# Altium footprint library Boris_IO.PcbLib: 57 footprints (part 3 of 4)
Each footprint in its own frame and in the unit in brackets; x right, y up, seen from the top. Pads: shape width x height; smd on the part's side, far side on the other; paste and mask are expansions set on the pad; w line width, h text height; cw(c..) or ccw(c..) is an arc to the next point about the centre after c.
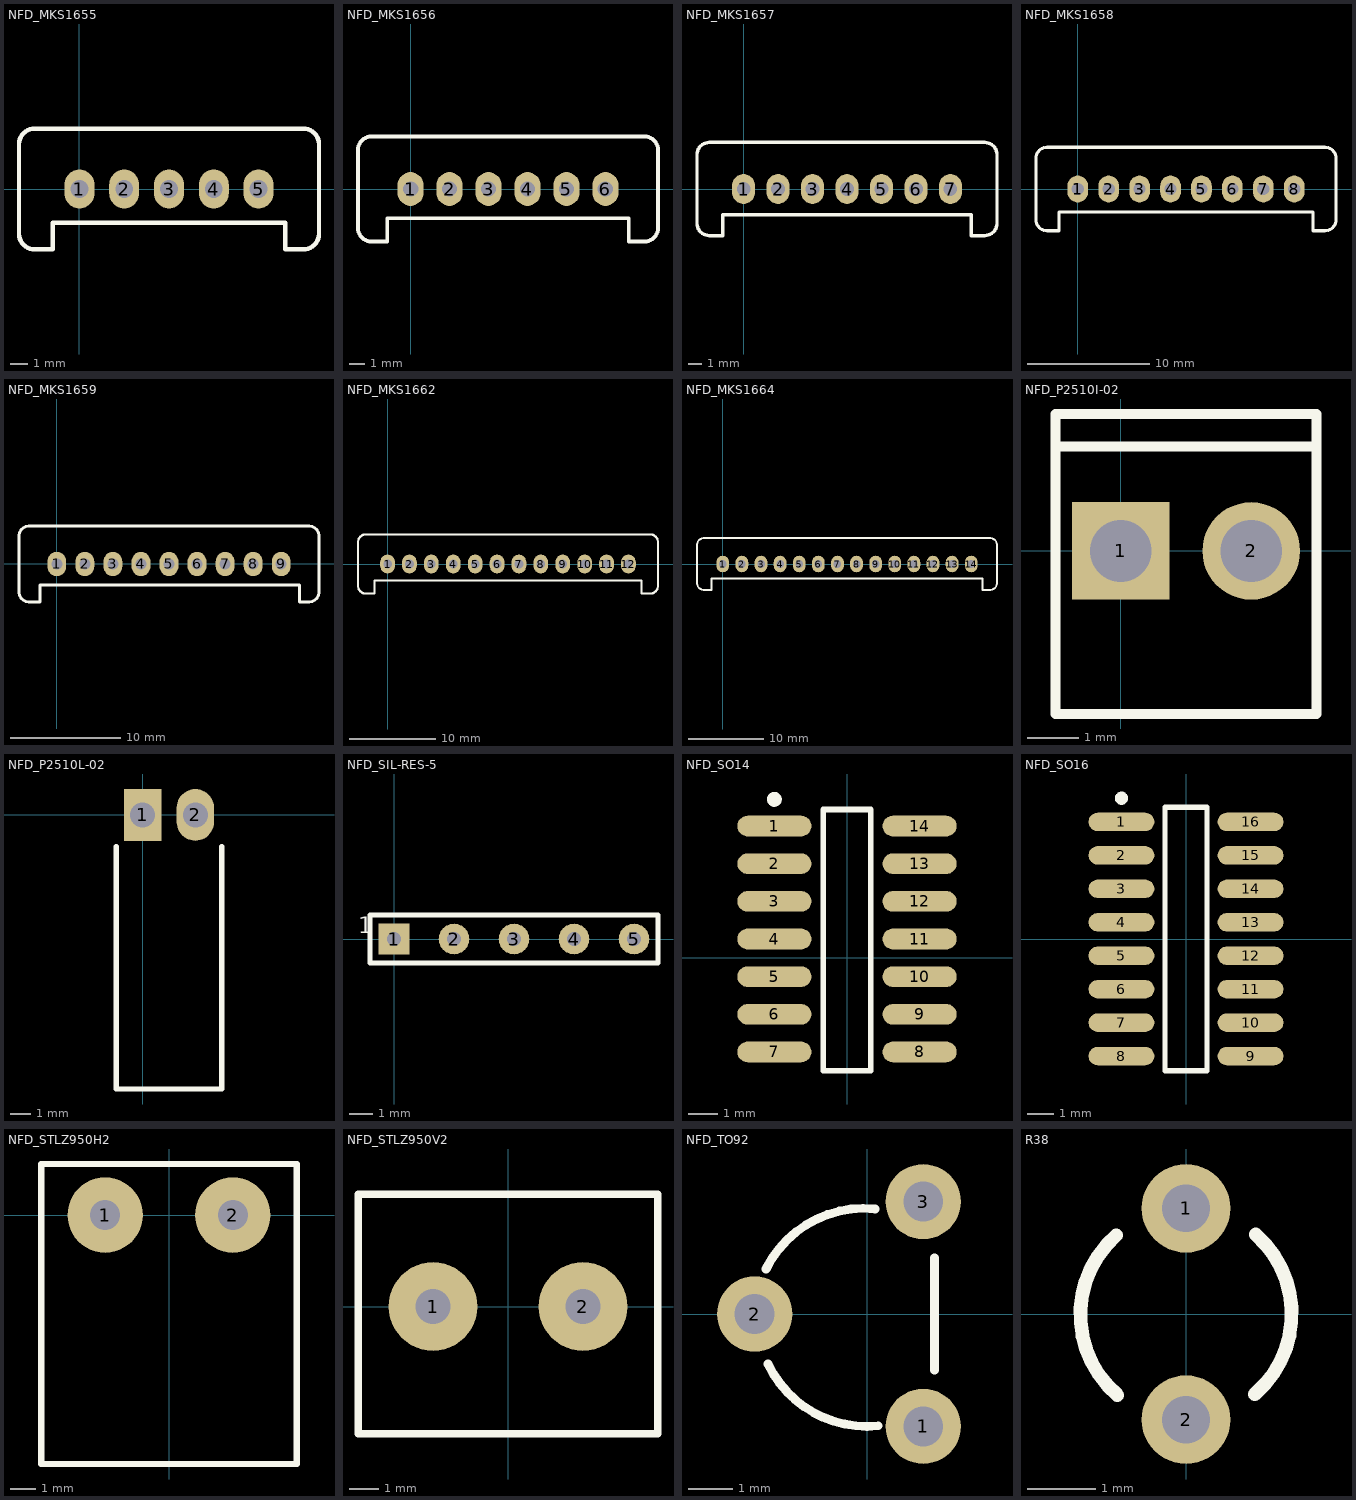
[diagram p2: the footprints below, top view; thin cyan lines are the x and y axes]

## NFD_MKS1655 [mm]
pads (5):
  oval 1.7x2.2 hole 1: 1(0,0) 2(2.54,0) 3(5.08,0) 4(7.62,0) 5(10.16,0)
Top Overlay:
  lines w0.254: -3.429,-2.54 ccw(c-2.54,-2.54) -2.54,-3.429 -1.524,-3.429 -1.524,-1.905 11.684,-1.905 11.684,-3.429 12.7,-3.429 ccw(c12.7,-2.54) 13.589,-2.54 13.589,2.54 ccw(c12.7,2.54) 12.7,3.429 -2.54,3.429 ccw(c-2.54,2.54) -3.429,2.54 -3.429,-2.54

## NFD_MKS1656 [mm]
pads (6):
  oval 1.7x2.2 hole 1: 1(0,0) 2(2.54,0) 3(5.08,0) 4(7.62,0) 5(10.16,0) 6(12.7,0)
Top Overlay:
  lines w0.254: -3.429,-2.54 ccw(c-2.54,-2.54) -2.54,-3.429 -1.524,-3.429 -1.524,-1.905 14.224,-1.905 14.224,-3.429 15.24,-3.429 ccw(c15.24,-2.54) 16.129,-2.54 16.129,2.54 ccw(c15.24,2.54) 15.24,3.429 -2.54,3.429 ccw(c-2.54,2.54) -3.429,2.54 -3.429,-2.54

## NFD_MKS1657 [mm]
pads (7):
  oval 1.7x2.2 hole 1: 1(0,0) 2(2.54,0) 3(5.08,0) 4(7.62,0) 5(10.16,0) 6(12.7,0) 7(15.24,0)
Top Overlay:
  lines w0.254: -3.429,-2.54 ccw(c-2.54,-2.54) -2.54,-3.429 -1.524,-3.429 -1.524,-1.905 16.764,-1.905 16.764,-3.429 17.78,-3.429 ccw(c17.78,-2.54) 18.669,-2.54 18.669,2.54 ccw(c17.78,2.54) 17.78,3.429 -2.54,3.429 ccw(c-2.54,2.54) -3.429,2.54 -3.429,-2.54

## NFD_MKS1658 [mm]
pads (8):
  oval 1.7x2.2 hole 1: 1(0,0) 2(2.54,0) 3(5.08,0) 4(7.62,0) 5(10.16,0) 6(12.7,0) 7(15.24,0) 8(17.78,0)
Top Overlay:
  lines w0.254: -3.429,-2.54 ccw(c-2.54,-2.54) -2.54,-3.429 -1.524,-3.429 -1.524,-1.905 19.304,-1.905 19.304,-3.429 20.32,-3.429 ccw(c20.32,-2.54) 21.209,-2.54 21.209,2.54 ccw(c20.32,2.54) 20.32,3.429 -2.54,3.429 ccw(c-2.54,2.54) -3.429,2.54 -3.429,-2.54

## NFD_MKS1659 [mm]
pads (9):
  oval 1.7x2.2 hole 1: 1(0,0) 2(2.54,0) 3(5.08,0) 4(7.62,0) 5(10.16,0) 6(12.7,0) 7(15.24,0) 8(17.78,0) 9(20.32,0)
Top Overlay:
  lines w0.254: -3.429,-2.54 ccw(c-2.54,-2.54) -2.54,-3.429 -1.524,-3.429 -1.524,-1.905 21.971,-1.905 21.971,-3.429 22.86,-3.429 ccw(c22.86,-2.54) 23.749,-2.54 23.749,2.54 ccw(c22.86,2.54) 22.86,3.429 -2.54,3.429 ccw(c-2.54,2.54) -3.429,2.54 -3.429,-2.54

## NFD_MKS1662 [mm]
pads (12):
  oval 1.7x2.2 hole 1: 1(0,0) 2(2.54,0) 3(5.08,0) 4(7.62,0) 5(10.16,0) 6(12.7,0) 7(15.24,0) 8(17.78,0) 9(20.32,0) 10(22.86,0) 11(25.4,0) 12(27.94,0)
Top Overlay:
  lines w0.254: -3.429,-2.54 ccw(c-2.54,-2.54) -2.54,-3.429 -1.524,-3.429 -1.524,-1.905 29.464,-1.905 29.464,-3.429 30.48,-3.429 ccw(c30.48,-2.54) 31.369,-2.54 31.369,2.54 ccw(c30.48,2.54) 30.48,3.429 -2.54,3.429 ccw(c-2.54,2.54) -3.429,2.54 -3.429,-2.54

## NFD_MKS1664 [mm]
pads (14):
  oval 1.7x2.2 hole 1: 1(0,0) 2(2.54,0) 3(5.08,0) 4(7.62,0) 5(10.16,0) 6(12.7,0) 7(15.24,0) 8(17.78,0) 9(20.32,0) 10(22.86,0) 11(25.4,0) 12(27.94,0) 13(30.48,0) 14(33.02,0)
Top Overlay:
  lines w0.254: -3.429,-2.54 ccw(c-2.54,-2.54) -2.54,-3.429 -1.524,-3.429 -1.524,-1.905 34.544,-1.905 34.544,-3.429 35.56,-3.429 ccw(c35.56,-2.54) 36.449,-2.54 36.449,2.54 ccw(c35.56,2.54) 35.56,3.429 -2.54,3.429 ccw(c-2.54,2.54) -3.429,2.54 -3.429,-2.54

## NFD_P2510I-02 [mm] "Connector; Header; 3x2 Position"
pads (2):
  rect 1.9x1.9 hole 1.2: 1(0,0)
  round 1.9 hole 1.2: 2(2.54,0)
Top Overlay:
  lines w0.2: -1.27,2.032 3.81,2.032 ; -1.27,-3.175 -1.27,2.667 3.81,2.667 3.81,-3.175 -1.27,-3.175
3D body: height 11.73, standoff -2.55, extent -1.33,-3.2 3.87,2.7

## NFD_P2510L-02 [mm] "Connector; Header; 18 Position"
pads (2):
  rect 1.8x2.5 hole 1.2: 1(0,0)
  oval 1.8x2.5 hole 1.2: 2(2.54,0)
Top Overlay:
  lines w0.254: -1.27,-1.524 -1.27,-13.208 3.81,-13.208 3.81,-1.524

## NFD_SIL-RES-5 [mm] "Connector; Header; 3x2 Position"
pads (5):
  rect 1.3x1.3 hole 0.6: 1(0,0)
  round 1.3 hole 0.6: 2(2.54,0) 3(5.08,0) 4(7.62,0) 5(10.16,0)
Top Overlay:
  lines w0.2: -1.016,-1.016 -1.016,1.016 11.176,1.016 11.176,-1.016 -1.016,-1.016
  text "1" at -1.524,0.254 h0.7
3D body: height 5.63, standoff -2.95, extent -1.27,-1.26 11.43,1.25

## NFD_SO14 [mm] "SOIC, 16-Leads, Body 9.9x3.9mm, Pitch 1.27mm, IPC Low Density"
height 1.75
pads (14):
  oval 2.5x0.7 smd: 1(-2.45,4.445) 2(-2.45,3.175) 3(-2.45,1.905) 4(-2.45,0.635) 5(-2.45,-0.635) 6(-2.45,-1.905) 7(-2.45,-3.175) 8(2.45,-3.175) 9(2.45,-1.905) 10(2.45,-0.635) 11(2.45,0.635) 12(2.45,1.905) 13(2.45,3.175) 14(2.45,4.445)
Top Overlay:
  circle w0.25: c-2.45,5.345 r0.125
  lines w0.2: -0.8,-3.81 -0.8,5 0.8,5 0.8,-3.81 -0.8,-3.81
3D body: height 1.78, standoff 0.01, extent -3.068,-3.715 3.069,4.985

## NFD_SO16 [mm] "SOIC, 16-Leads, Body 9.9x3.9mm, Pitch 1.27mm, IPC Low Density"
height 1.75
pads (16):
  oval 2.5x0.7 smd: 1(-2.45,4.445) 2(-2.45,3.175) 3(-2.45,1.905) 4(-2.45,0.635) 5(-2.45,-0.635) 6(-2.45,-1.905) 7(-2.45,-3.175) 8(-2.45,-4.445) 9(2.45,-4.445) 10(2.45,-3.175) 11(2.45,-1.905) 12(2.45,-0.635) 13(2.45,0.635) 14(2.45,1.905) 15(2.45,3.175) 16(2.45,4.445)
Top Overlay:
  circle w0.25: c-2.45,5.345 r0.125
  lines w0.2: -0.8,-5 -0.8,5 0.8,5 0.8,-5 -0.8,-5
3D body: height 1.7, standoff 0, extent -3,-5.1 3,5.1

## NFD_STLZ950H2 [mm]
pads (2):
  round 3 hole 1.2: 1(-2.54,0) 2(2.54,0)
Top Overlay:
  lines w0.254: -5.08,-9.906 -5.08,2.032 0,2.032 5.08,2.032 5.08,-9.906 -4.572,-9.906 -5.08,-9.906

## NFD_STLZ950V2 [mm]
pads (2):
  round 3 hole 1.2: 1(-2.54,0) 2(2.54,0)
Top Overlay:
  lines w0.254: -5.08,-4.318 1.016,-4.318 5.08,-4.318 5.08,3.81 1.27,3.81 -5.08,3.81 -5.08,-4.318
3D body: height 12.1, standoff -4.5, extent -5.08,-4.318 5.08,3.882

## NFD_TO92 [mm] "TO, Flat Index; 3 In-Line, Axial Leads; Body Dia. 4.5mm; Leads 0.51 x 0.48 mm (max)"
height 6.86
pads (3):
  round 1.7 hole 0.9: 1(1.27,-2.54) 2(-2.54,0) 3(1.27,2.54)
Top Overlay:
  lines w0.2: -2.286,1.016 cw(c-0.064,-0.095) 0.183,2.377 ; -2.241,-1.127 ccw(c0,-0.056) 0.253,-2.527 ; 1.524,-1.27 1.524,1.27
3D body: height 10.29, standoff -2.11, extent -2.766,-2.795 1.524,2.795

## R38 [mm] "Crystal, Thru-Hole; 2 Leads; Body 3.1 x 8.2 mm (Dia.xH)"
height 8.2
pads (2):
  round 1.3 hole 0.7: 1(0,1.55) 2(0,-1.55)
Top Overlay:
  lines w0.2: -1.022,1.155 ccw(c0,-0.01) -1.006,-1.189 ; 1.006,-1.179 ccw(c0,0) 1.022,1.165